# Altium footprint library Tomra_Cadstar_Footprints.PcbLib: 380 footprints (part 10 of 24)
Each footprint in its own frame and in the unit in brackets; x right, y up, seen from the top. Pads: shape width x height; smd on the part's side, far side on the other; paste and mask are expansions set on the pad; w line width, h text height; cw(c..) or ccw(c..) is an arc to the next point about the centre after c.
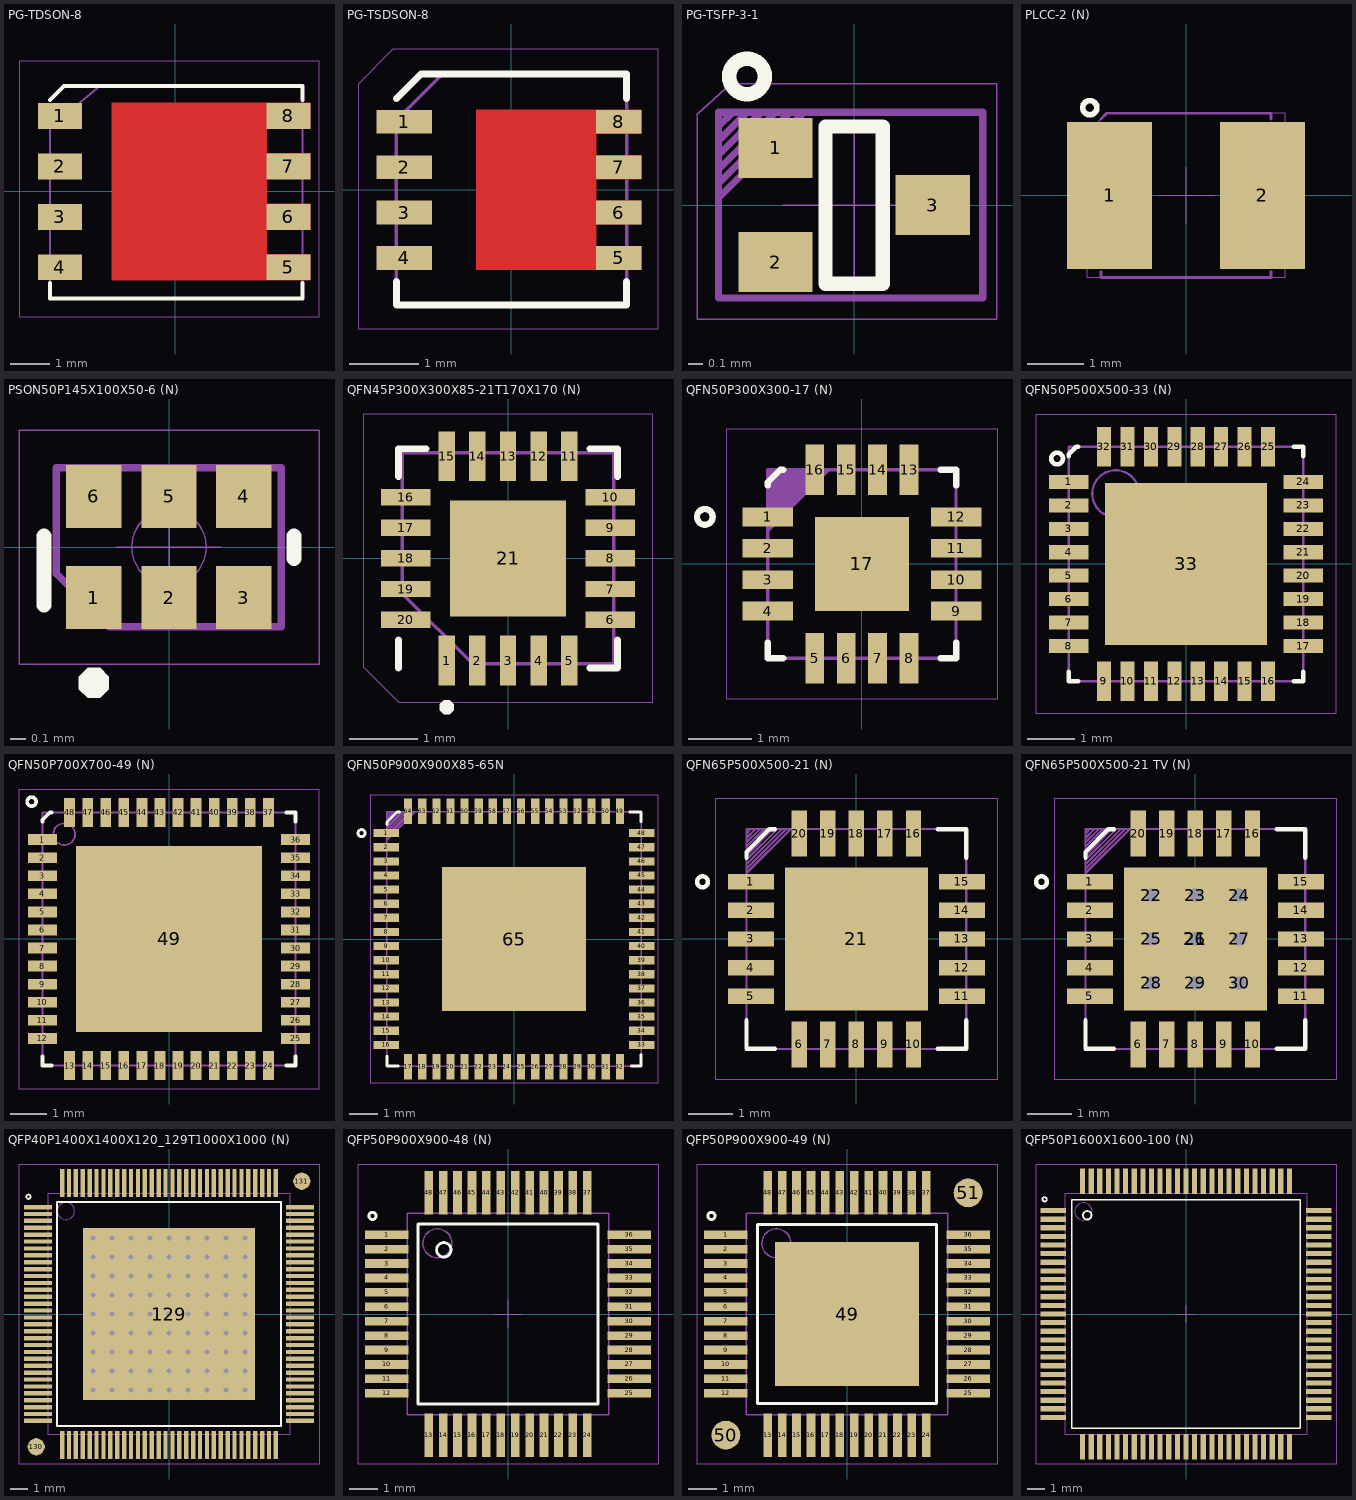
[diagram p9: the footprints below, top view; thin cyan lines are the x and y axes]

## PG-TDSON-8 [mm]
height 1
pads (8):
  rect 1.1x0.65 smd paste+0 mask+0: 1(-2.9,1.9) 2(-2.9,0.63) 3(-2.9,-0.64) 4(-2.9,-1.91) 5(2.85,-1.91) 6(2.85,-0.64) 7(2.85,0.63) 8(2.85,1.9)
Top Elec:
  region: -1.59,2.225 3.4,2.225 3.4,1.575 2.3,1.575 2.3,0.965 3.4,0.965 3.4,0.315 2.3,0.315 2.3,-0.305 3.4,-0.305 3.4,-0.955 2.3,-0.955 2.3,-1.585 3.4,-1.585 3.4,-2.235 -1.59,-2.235
Top Silk:
  lines w0.1: -3.15,-2.3 -3.15,-2.7 3.2,-2.7 3.2,-2.3 ; -3.15,2.3 -2.8,2.65 3.2,2.65 3.2,2.3
  text ".Designator" at 0,0 h0.7
Top Paste:
  region: -1.585,-2.225 0.1,-2.225 0.1,-0.32 -1.585,-0.32
  region: 0.93,-2.23 3.39,-2.23 3.39,-1.587 2.055,-1.587 2.055,-0.963 3.39,-0.963 3.39,-0.32 0.93,-0.32
  region: -1.585,0.31 0.1,0.31 0.1,2.215 -1.585,2.215
  region: 0.93,0.31 3.39,0.31 3.39,0.95 2.05,0.95 2.05,1.58 3.39,1.58 3.39,2.22 0.93,2.22
Top Solder Resist:
  region: -1.59,2.225 3.4,2.225 3.4,1.575 2.3,1.575 2.3,0.965 3.4,0.965 3.4,0.315 2.3,0.315 2.3,-0.305 3.4,-0.305 3.4,-0.955 2.3,-0.955 2.3,-1.585 3.4,-1.585 3.4,-2.235 -1.59,-2.235
Top Assembly:
  lines w0.05: -3.15,-2.7 3.2,-2.7 3.2,2.652 -1.899,2.652 -3.15,1.598 -3.15,-2.7
Top Placement:
  lines w0.01: -3.93,-3.159 3.62,-3.159 3.62,3.278 -3.93,3.28 -3.93,-3.159

## PG-TSDSON-8 [mm]
height 1
pads (8):
  rrect0% 0.8x0.34 smd paste+0 mask+0: 1(-1.538,0.975) 2(-1.538,0.325) 3(-1.538,-0.325) 4(-1.538,-0.975)
  rrect0% 0.65x0.34 smd paste+0 mask+0: 5(1.538,-0.975) 6(1.538,-0.325) 7(1.538,0.325) 8(1.538,0.975)
Top Elec:
  region: -0.502,1.146 1.862,1.146 1.862,0.805 1.212,0.805 1.212,0.495 1.862,0.495 1.862,0.155 1.212,0.155 1.212,-0.155 1.862,-0.155 1.862,-0.495 1.212,-0.495 1.212,-0.805 1.862,-0.805 1.862,-1.146 -0.502,-1.146
Top Silk:
  lines w0.1: -1.65,-1.31 -1.65,-1.65 1.65,-1.65 1.65,-1.31 ; -1.65,1.31 -1.3,1.66 1.65,1.66 1.65,1.31
  text ".Designator" at 0,0 h0.7
Top Paste:
  region: -0.5,0.152 0.35,0.152 0.35,1.132 -0.5,1.132
  region: 0.663,-1.14 1.857,-1.14 1.857,-0.81 1.207,-0.81 1.207,-0.488 1.857,-0.488 1.857,-0.163 0.663,-0.165
  region: 0.658,0.16 1.857,0.16 1.857,0.49 1.207,0.49 1.207,0.81 1.857,0.81 1.857,1.133 0.658,1.133
  region: -0.492,-1.14 0.351,-1.14 0.35,-0.158 -0.492,-0.157
Top Solder Resist:
  region: 1.863,1.15 1.863,0.8 1.212,0.8 1.212,0.503 1.863,0.503 1.863,0.15 1.212,0.15 1.212,-0.15 1.863,-0.15 1.863,-0.5 1.212,-0.5 1.212,-0.8 1.863,-0.8 1.863,-1.15 -0.513,-1.15 -0.513,1.15
Top Assembly:
  lines w0.05: -1.65,-1.65 1.65,-1.65 1.65,1.65 -1,1.65 -1.65,1 -1.65,-1.65
Top Placement:
  lines w0.01: -2.2,-1.987 2.1,-1.987 2.1,2.013 -1.7,2.013 -2.2,1.513 -2.2,-1.987

## PG-TSFP-3-1 [mm]
height 0.6
pads (3):
  rect 0.52x0.42 smd paste+0 mask+0: 1(-0.55,0.4) 2(-0.55,-0.4) 3(0.55,0)
Top Silk:
  lines w0.1: -0.875,0.9 cw(c-0.75,0.9) -0.625,0.9 cw(c-0.75,0.9) -0.875,0.9 ; -0.2,-0.55 0.2,-0.55 0.2,0.55 -0.2,0.55 -0.2,-0.55
  text ".Designator" at -3.599,0 h0.7
Top Assembly:
  lines w0.05: -0.95,0.05 -0.35,0.65 ; -0.95,0.15 -0.45,0.65 ; -0.95,0.25 -0.55,0.65 ; -0.95,0.35 -0.65,0.65 ; -0.95,0.45 -0.75,0.65 ; -0.95,0.55 -0.85,0.65 ; -0.95,-0.65 0.9,-0.65 0.9,0.65 -0.95,0.65 -0.95,-0.65
Top Placement:
  lines w0.01: -0.5,0 0.5,0 ; 0,-0.5 0,0.5 ; -1.1,-0.8 1,-0.8 1,0.85 -0.865,0.85 -1.1,0.636 -1.1,-0.8

## PLCC-2 (N) [mm]
height 2
pads (2):
  rrect0% 1.5x2.6 smd paste+0 mask+0: 1(-1.35,0) 2(1.35,0)
Top Silk:
  lines w0.1: -1.825,1.55 cw(c-1.7,1.55) -1.575,1.55 cw(c-1.7,1.55) -1.825,1.55
  text ".Designator" at -3.599,-0.35 h0.7
Top Assembly:
  lines w0.05: -1.5,-1.35 -1.5,-1.45 1.5,-1.45 1.5,-1.35 ; -1.5,1.35 -1.4,1.45 1.5,1.45 1.5,1.35
Top Placement:
  lines w0.01: -0.5,0 0.5,0 ; 0,-0.5 0,0.5 ; -1.75,-1.45 1.75,-1.45 1.75,1.45 -1.4,1.45 -1.75,1.1 -1.75,-1.45

## PSON50P145X100X50-6 (N) [mm]
height 0.5
pads (6):
  rect 0.37x0.42 smd paste+0 mask+0: 1(-0.5,-0.337) 2(0,-0.337) 3(0.5,-0.337) 4(0.5,0.337) 5(0,0.337) 6(-0.5,0.337)
Top Silk:
  region: -0.6,-0.905 -0.6,-0.864 -0.541,-0.805 -0.459,-0.805 -0.4,-0.864 -0.4,-0.905 -0.4,-0.946 -0.459,-1.005 -0.541,-1.005 -0.6,-0.946
  lines w0.1: -0.835,-0.385 -0.835,0.075 ; 0.835,-0.075 0.835,0.075
  text ".Designator" at -3.599,-0.35 h0.7
Top Assembly:
  lines w0.05: -0.75,-0.177 -0.397,-0.53 0.75,-0.53 0.75,0.53 -0.75,0.53 -0.75,-0.177
Top Placement:
  lines w0.01: -0.35,0 0.35,0 ; 0,-0.35 0,0.35 ; -1,-0.78 -1,0.78 1,0.78 1,-0.78 -1,-0.78 ; -0.25,0 cw(c0,0) 0.25,0 cw(c0,0) -0.25,0

## QFN45P300X300X85-21T170X170 (N) [mm]
height 0.85
pads (21):
  rect 0.24x0.73 smd paste+0 mask+0: 1(-0.9,-1.5) 2(-0.45,-1.5) 3(0,-1.5) 4(0.45,-1.5) 5(0.9,-1.5) 11(0.9,1.5) 12(0.45,1.5) 13(0,1.5) 14(-0.45,1.5) 15(-0.9,1.5)
  rect 0.73x0.24 smd paste+0 mask+0: 6(1.5,-0.9) 7(1.5,-0.45) 8(1.5,0) 9(1.5,0.45) 10(1.5,0.9) 16(-1.5,0.9) 17(-1.5,0.45) 18(-1.5,0) 19(-1.5,-0.45) 20(-1.5,-0.9)
  rect 1.7x1.7 smd paste+0 mask+0: 21(0,0)
Top Silk:
  region: -1,-2.185 -1,-2.144 -0.941,-2.085 -0.859,-2.085 -0.8,-2.144 -0.8,-2.185 -0.8,-2.226 -0.859,-2.285 -0.941,-2.285 -1,-2.226
  lines w0.1: -1.61,-1.61 -1.61,-1.2 ; -1.61,1.2 -1.61,1.61 -1.2,1.61 ; 1.2,-1.61 1.61,-1.61 1.61,-1.2 ; 1.2,1.61 1.61,1.61 1.61,1.2
  text ".Designator" at -3.599,-0.35 h0.7
Top Assembly:
  lines w0.05: -1.55,-0.517 -0.517,-1.55 1.55,-1.55 1.55,1.55 -1.55,1.55 -1.55,-0.517
Top Placement:
  lines w0.01: -0.35,0 0.35,0 ; 0,-0.35 0,0.35 ; -2.12,-1.6 -1.6,-2.12 2.12,-2.12 2.12,2.12 -2.12,2.12 -2.12,-1.6 ; -0.25,0 cw(c0,0) 0.25,0 cw(c0,0) -0.25,0

## QFN50P300X300-17 (N) [mm]
height 0.8
pads (17):
  rect 0.8x0.3 smd paste+0 mask+0: 1(-1.5,0.75) 2(-1.5,0.25) 3(-1.5,-0.25) 4(-1.5,-0.75) 9(1.5,-0.75) 10(1.5,-0.25) 11(1.5,0.25) 12(1.5,0.75)
  rect 0.3x0.8 smd paste+0 mask+0: 5(-0.75,-1.5) 6(-0.25,-1.5) 7(0.25,-1.5) 8(0.75,-1.5) 13(0.75,1.5) 14(0.25,1.5) 15(-0.25,1.5) 16(-0.75,1.5)
  rect 1.5x1.5 smd paste-0.55 mask+0: 17(0,0)
Top Silk:
  lines w0.1: -1.5,-1.25 -1.5,-1.5 -1.25,-1.5 ; -1.5,1.25 -1.5,1.3 -1.3,1.5 -1.25,1.5 ; 1.25,-1.5 1.5,-1.5 1.5,-1.25 ; 1.25,1.5 1.5,1.5 1.5,1.25 ; -2.625,0.75 cw(c-2.5,0.75) -2.375,0.75 cw(c-2.5,0.75) -2.625,0.75
  text ".Designator" at -2.15,2.15 h0.7
Top Assembly:
  region: -1.5,0.5 -1.5,1.5 -0.5,1.5
  lines w0.05: -1.5,-1.5 -1.5,1.5 1.5,1.5 1.5,-1.5 -1.5,-1.5
Top Placement:
  lines w0.01: -0.5,0 0.5,0 ; 0,-0.5 0,0.5 ; -2.15,-2.15 -2.15,2.15 2.15,2.15 2.15,-2.15 -2.15,-2.15

## QFN50P500X500-33 (N) [mm]
height 0.8
pads (33):
  rect 0.85x0.3 smd paste+0 mask+0: 1(-2.5,1.75) 2(-2.5,1.25) 3(-2.5,0.75) 4(-2.5,0.25) 5(-2.5,-0.25) 6(-2.5,-0.75) 7(-2.5,-1.25) 8(-2.5,-1.75) 17(2.5,-1.75) 18(2.5,-1.25) 19(2.5,-0.75) 20(2.5,-0.25) 21(2.5,0.25) 22(2.5,0.75) 23(2.5,1.25) 24(2.5,1.75)
  rect 0.3x0.85 smd paste+0 mask+0: 9(-1.75,-2.5) 10(-1.25,-2.5) 11(-0.75,-2.5) 12(-0.25,-2.5) 13(0.25,-2.5) 14(0.75,-2.5) 15(1.25,-2.5) 16(1.75,-2.5) 25(1.75,2.5) 26(1.25,2.5) 27(0.75,2.5) 28(0.25,2.5) 29(-0.25,2.5) 30(-0.75,2.5) 31(-1.25,2.5) 32(-1.75,2.5)
  rect 3.45x3.45 smd paste-1.268 mask+0: 33(0,0)
Top Silk:
  lines w0.1: -2.5,-2.3 -2.5,-2.5 -2.3,-2.5 ; -2.5,2.3 -2.5,2.34 -2.34,2.5 -2.3,2.5 ; 2.3,-2.5 2.5,-2.5 2.5,-2.3 ; 2.3,2.5 2.5,2.5 2.5,2.3 ; -2.875,2.25 cw(c-2.75,2.25) -2.625,2.25 cw(c-2.75,2.25) -2.875,2.25
  text ".Designator" at -3.599,-0.35 h0.7
Top Assembly:
  lines w0.05: -2.5,-2.5 -2.5,2.5 2.5,2.5 2.5,-2.5 -2.5,-2.5 ; -2,1.5 cw(c-1.5,1.5) -1,1.5 cw(c-1.5,1.5) -2,1.5
Top Placement:
  lines w0.01: -0.5,0 0.5,0 ; 0,-0.5 0,0.5 ; -3.2,-3.2 -3.2,3.2 3.2,3.2 3.2,-3.2 -3.2,-3.2

## QFN50P700X700-49 (N) [mm]
height 1
pads (49):
  rect 0.8x0.3 smd paste+0 mask+0: 1(-3.5,2.75) 2(-3.5,2.25) 3(-3.5,1.75) 4(-3.5,1.25) 5(-3.5,0.75) 6(-3.5,0.25) 7(-3.5,-0.25) 8(-3.5,-0.75) 9(-3.5,-1.25) 10(-3.5,-1.75) 11(-3.5,-2.25) 12(-3.5,-2.75) 25(3.5,-2.75) 26(3.5,-2.25) 27(3.5,-1.75) 28(3.5,-1.25) 29(3.5,-0.75) 30(3.5,-0.25) 31(3.5,0.25) 32(3.5,0.75) 33(3.5,1.25) 34(3.5,1.75) 35(3.5,2.25) 36(3.5,2.75)
  rect 0.3x0.8 smd paste+0 mask+0: 13(-2.75,-3.5) 14(-2.25,-3.5) 15(-1.75,-3.5) 16(-1.25,-3.5) 17(-0.75,-3.5) 18(-0.25,-3.5) 19(0.25,-3.5) 20(0.75,-3.5) 21(1.25,-3.5) 22(1.75,-3.5) 23(2.25,-3.5) 24(2.75,-3.5) 37(2.75,3.5) 38(2.25,3.5) 39(1.75,3.5) 40(1.25,3.5) 41(0.75,3.5) 42(0.25,3.5) 43(-0.25,3.5) 44(-0.75,3.5) 45(-1.25,3.5) 46(-1.75,3.5) 47(-2.25,3.5) 48(-2.75,3.5)
  rect 5.15x5.15 smd paste+0 mask+0: 49(0,0)
Top Silk:
  lines w0.1: -3.5,-3.25 -3.5,-3.5 -3.25,-3.5 ; -3.5,3.25 -3.5,3.3 -3.3,3.5 -3.25,3.5 ; 3.25,-3.5 3.5,-3.5 3.5,-3.25 ; 3.25,3.5 3.5,3.5 3.5,3.25 ; -3.925,3.8 cw(c-3.8,3.8) -3.675,3.8 cw(c-3.8,3.8) -3.925,3.8
  text ".Designator" at -3.599,4.45 h0.7
Top Paste:
  drawing of 25 lines, arcs and shapes, not listed
Top Assembly:
  lines w0.05: -3.5,-3.5 -3.5,3.5 3.5,3.5 3.5,-3.5 -3.5,-3.5 ; -3.2,2.9 cw(c-2.9,2.9) -2.6,2.9 cw(c-2.9,2.9) -3.2,2.9
Top Placement:
  lines w0.01: -4.15,-4.15 -4.15,4.15 4.15,4.15 4.15,-4.15 -4.15,-4.15

## QFN50P900X900X85-65N [mm]
height 0.85
pads (65):
  rect 0.9x0.29 smd paste+0 mask+0: 1(-4.525,3.75) 2(-4.525,3.25) 3(-4.525,2.75) 4(-4.525,2.25) 5(-4.525,1.75) 6(-4.525,1.25) 7(-4.525,0.75) 8(-4.525,0.25) 9(-4.525,-0.25) 10(-4.525,-0.75) 11(-4.525,-1.25) 12(-4.525,-1.75) 13(-4.525,-2.25) 14(-4.525,-2.75) 15(-4.525,-3.25) 16(-4.525,-3.75) 33(4.525,-3.75) 34(4.525,-3.25) 35(4.525,-2.75) 36(4.525,-2.25) 37(4.525,-1.75) 38(4.525,-1.25) 39(4.525,-0.75) 40(4.525,-0.25) 41(4.525,0.25) 42(4.525,0.75) 43(4.525,1.25) 44(4.525,1.75) 45(4.525,2.25) 46(4.525,2.75) 47(4.525,3.25) 48(4.525,3.75)
  rect 0.29x0.9 smd paste+0 mask+0: 17(-3.75,-4.525) 18(-3.25,-4.525) 19(-2.75,-4.525) 20(-2.25,-4.525) 21(-1.75,-4.525) 22(-1.25,-4.525) 23(-0.75,-4.525) 24(-0.25,-4.525) 25(0.25,-4.525) 26(0.75,-4.525) 27(1.25,-4.525) 28(1.75,-4.525) 29(2.25,-4.525) 30(2.75,-4.525) 31(3.25,-4.525) 32(3.75,-4.525) 49(3.75,4.525) 50(3.25,4.525) 51(2.75,4.525) 52(2.25,4.525) 53(1.75,4.525) 54(1.25,4.525) 55(0.75,4.525) 56(0.25,4.525) 57(-0.25,4.525) 58(-0.75,4.525) 59(-1.25,4.525) 60(-1.75,4.525) 61(-2.25,4.525) 62(-2.75,4.525) 63(-3.25,4.525) 64(-3.75,4.525)
  rect 5.1x5.1 smd paste+0 mask+0: 65(0,0)
Top Silk:
  lines w0.1: -4.5,-4.15 -4.5,-4.5 -4.1,-4.5 ; -4.5,4.05 -4.5,4.14 -4.14,4.5 -4.05,4.5 ; 4.1,4.5 4.5,4.5 4.5,4.15 ; 4.15,-4.5 4.5,-4.5 4.5,-4.1 ; -5.525,3.75 cw(c-5.4,3.75) -5.275,3.75 cw(c-5.4,3.75) -5.525,3.75
  text ".Designator" at -3.599,5.25 h0.7
Top Assembly:
  lines w0.05: -4.5,3.5 -3.5,4.5 ; -4.5,3.6 -3.6,4.5 ; -4.5,3.7 -3.7,4.5 ; -4.5,3.8 -3.8,4.5 ; -4.5,3.9 -3.9,4.5 ; -4.5,4 -4,4.5 ; -4.5,4.1 -4.1,4.5 ; -4.5,4.2 -4.2,4.5 ; -4.5,4.3 -4.3,4.5 ; -4.5,4.4 -4.4,4.5 ; -4.5,-4.5 -4.5,4.5 4.5,4.5 4.5,-4.5 -4.5,-4.5
Top Placement:
  lines w0.01: -5.1,-5.1 -5.1,5.1 5.1,5.1 5.1,-5.1 -5.1,-5.1

## QFN65P500X500-21 (N) [mm]
height 0.8
pads (21):
  rect 1.05x0.35 smd paste+0 mask+0: 1(-2.4,1.3) 2(-2.4,0.65) 3(-2.4,0) 4(-2.4,-0.65) 5(-2.4,-1.3) 11(2.4,-1.3) 12(2.4,-0.65) 13(2.4,0) 14(2.4,0.65) 15(2.4,1.3)
  rect 0.35x1.05 smd paste+0 mask+0: 6(-1.3,-2.4) 7(-0.65,-2.4) 8(0,-2.4) 9(0.65,-2.4) 10(1.3,-2.4) 16(1.3,2.4) 17(0.65,2.4) 18(0,2.4) 19(-0.65,2.4) 20(-1.3,2.4)
  rect 3.25x3.25 smd paste-1.2 mask+0: 21(0,0)
Top Silk:
  lines w0.1: -2.5,-1.85 -2.5,-2.5 -1.85,-2.5 ; -2.5,1.85 -2.5,1.98 -1.98,2.5 -1.85,2.5 ; 1.85,-2.5 2.5,-2.5 2.5,-1.85 ; 1.85,2.5 2.5,2.5 2.5,1.85 ; -3.625,1.3 cw(c-3.5,1.3) -3.375,1.3 cw(c-3.5,1.3) -3.625,1.3
  text ".Designator" at -3.599,-0.35 h0.7
Top Assembly:
  lines w0.05: -2.5,1.5 -1.5,2.5 ; -2.5,1.6 -1.6,2.5 ; -2.5,1.7 -1.7,2.5 ; -2.5,1.8 -1.8,2.5 ; -2.5,1.9 -1.9,2.5 ; -2.5,2 -2,2.5 ; -2.5,2.1 -2.1,2.5 ; -2.5,2.2 -2.2,2.5 ; -2.5,2.3 -2.3,2.5 ; -2.5,2.4 -2.4,2.5 ; -2.5,-2.5 -2.5,2.5 2.5,2.5 2.5,-2.5 -2.5,-2.5
Top Placement:
  lines w0.01: -0.5,0 0.5,0 ; 0,-0.5 0,0.5 ; -3.2,-3.2 -3.2,3.2 3.2,3.2 3.2,-3.2 -3.2,-3.2

## QFN65P500X500-21 TV (N) [mm]
height 0.8
pads (30):
  rect 1.05x0.35 smd paste+0 mask+0: 1(-2.4,1.3) 2(-2.4,0.65) 3(-2.4,0) 4(-2.4,-0.65) 5(-2.4,-1.3) 11(2.4,-1.3) 12(2.4,-0.65) 13(2.4,0) 14(2.4,0.65) 15(2.4,1.3)
  rect 0.35x1.05 smd paste+0 mask+0: 6(-1.3,-2.4) 7(-0.65,-2.4) 8(0,-2.4) 9(0.65,-2.4) 10(1.3,-2.4) 16(1.3,2.4) 17(0.65,2.4) 18(0,2.4) 19(-0.65,2.4) 20(-1.3,2.4)
  rect 3.25x3.25 smd paste-1.2 mask+0: 21(0,0)
  round 0.6 / inner round 1.524 / far side round 0.6 hole 0.3 paste+0 mask+0: 22(-1,1) 23(0,1) 24(1,1) 25(-1,0) 26(0,0) 27(1,0) 28(-1,-1) 29(0,-1) 30(1,-1)
Top Elec:
  lines w0.1: 1,-1 0,-1 -1,-1 -1,0 ; 1,0 0,0 -1,0 ; 1,1 0,1 -1,1 -1,0
Top Silk:
  lines w0.1: -2.5,-1.85 -2.5,-2.5 -1.85,-2.5 ; -2.5,1.85 -2.5,1.98 -1.98,2.5 -1.85,2.5 ; 1.85,-2.5 2.5,-2.5 2.5,-1.85 ; 1.85,2.5 2.5,2.5 2.5,1.85 ; -3.625,1.3 cw(c-3.5,1.3) -3.375,1.3 cw(c-3.5,1.3) -3.625,1.3
  text ".Designator" at -3.599,-0.35 h0.7
Top Assembly:
  lines w0.05: -2.5,1.5 -1.5,2.5 ; -2.5,1.6 -1.6,2.5 ; -2.5,1.7 -1.7,2.5 ; -2.5,1.8 -1.8,2.5 ; -2.5,1.9 -1.9,2.5 ; -2.5,2 -2,2.5 ; -2.5,2.1 -2.1,2.5 ; -2.5,2.2 -2.2,2.5 ; -2.5,2.3 -2.3,2.5 ; -2.5,2.4 -2.4,2.5 ; -2.5,-2.5 -2.5,2.5 2.5,2.5 2.5,-2.5 -2.5,-2.5
Top Placement:
  lines w0.01: -0.5,0 0.5,0 ; 0,-0.5 0,0.5 ; -3.2,-3.2 -3.2,3.2 3.2,3.2 3.2,-3.2 -3.2,-3.2

## QFP40P1400X1400X120_129T1000X1000 (N) [mm]
height 1.2
pads (212):
  rect 1.6x0.25 smd paste+0 mask+0: 1(-7.6,6.2) 2(-7.6,5.8) 3(-7.6,5.4) 4(-7.6,5) 5(-7.6,4.6) 6(-7.6,4.2) 7(-7.6,3.8) 8(-7.6,3.4) 9(-7.6,3) 10(-7.6,2.6) 11(-7.6,2.2) 12(-7.6,1.8) 13(-7.6,1.4) 14(-7.6,1) 15(-7.6,0.6) 16(-7.6,0.2) 17(-7.6,-0.2) 18(-7.6,-0.6) 19(-7.6,-1) 20(-7.6,-1.4) 21(-7.6,-1.8) 22(-7.6,-2.2) 23(-7.6,-2.6) 24(-7.6,-3) 25(-7.6,-3.4) 26(-7.6,-3.8) 27(-7.6,-4.2) 28(-7.6,-4.6) 29(-7.6,-5) 30(-7.6,-5.4) 31(-7.6,-5.8) 32(-7.6,-6.2) 65(7.6,-6.2) 66(7.6,-5.8) 67(7.6,-5.4) 68(7.6,-5) 69(7.6,-4.6) 70(7.6,-4.2) 71(7.6,-3.8) 72(7.6,-3.4) 73(7.6,-3) 74(7.6,-2.6) 75(7.6,-2.2) 76(7.6,-1.8) 77(7.6,-1.4) 78(7.6,-1) 79(7.6,-0.6) 80(7.6,-0.2) 81(7.6,0.2) 82(7.6,0.6) 83(7.6,1) 84(7.6,1.4) 85(7.6,1.8) 86(7.6,2.2) 87(7.6,2.6) 88(7.6,3) 89(7.6,3.4) 90(7.6,3.8) 91(7.6,4.2) 92(7.6,4.6) 93(7.6,5) 94(7.6,5.4) 95(7.6,5.8) 96(7.6,6.2)
  rect 0.25x1.6 smd paste+0 mask+0: 33(-6.2,-7.6) 34(-5.8,-7.6) 35(-5.4,-7.6) 36(-5,-7.6) 37(-4.6,-7.6) 38(-4.2,-7.6) 39(-3.8,-7.6) 40(-3.4,-7.6) 41(-3,-7.6) 42(-2.6,-7.6) 43(-2.2,-7.6) 44(-1.8,-7.6) 45(-1.4,-7.6) 46(-1,-7.6) 47(-0.6,-7.6) 48(-0.2,-7.6) 49(0.2,-7.6) 50(0.6,-7.6) 51(1,-7.6) 52(1.4,-7.6) 53(1.8,-7.6) 54(2.2,-7.6) 55(2.6,-7.6) 56(3,-7.6) 57(3.4,-7.6) 58(3.8,-7.6) 59(4.2,-7.6) 60(4.6,-7.6) 61(5,-7.6) 62(5.4,-7.6) 63(5.8,-7.6) 64(6.2,-7.6) 97(6.2,7.6) 98(5.8,7.6) 99(5.4,7.6) 100(5,7.6) 101(4.6,7.6) 102(4.2,7.6) 103(3.8,7.6) 104(3.4,7.6) 105(3,7.6) 106(2.6,7.6) 107(2.2,7.6) 108(1.8,7.6) 109(1.4,7.6) 110(1,7.6) 111(0.6,7.6) 112(0.2,7.6) 113(-0.2,7.6) 114(-0.6,7.6) 115(-1,7.6) 116(-1.4,7.6) 117(-1.8,7.6) 118(-2.2,7.6) 119(-2.6,7.6) 120(-3,7.6) 121(-3.4,7.6) 122(-3.8,7.6) 123(-4.2,7.6) 124(-4.6,7.6) 125(-5,7.6) 126(-5.4,7.6) 127(-5.8,7.6) 128(-6.2,7.6)
  rect 10x10 smd paste+0 mask+0: 129(0,0)
  round 1 smd paste+0 mask+0: 130(-7.7,-7.7) 131(7.7,7.7)
  round 0.6 / inner round 1.524 / far side round 0.6 hole 0.3 paste+0 mask+0: 132(-4.4,4.4) 133(-3.3,4.4) 134(-2.2,4.4) 135(-1.1,4.4) 136(0,4.4) 137(1.1,4.4) 138(2.2,4.4) 139(3.3,4.4) 140(4.4,4.4) 141(-4.4,3.3) 142(-3.3,3.3) 143(-2.2,3.3) 144(-1.1,3.3) 145(0,3.3) 146(1.1,3.3) 147(2.2,3.3) 148(3.3,3.3) 149(4.4,3.3) 150(-4.4,2.2) 151(-3.3,2.2) 152(-2.2,2.2) 153(-1.1,2.2) 154(0,2.2) 155(1.1,2.2) 156(2.2,2.2) 157(3.3,2.2) 158(4.4,2.2) 159(-4.4,1.1) 160(-3.3,1.1) 161(-2.2,1.1) 162(-1.1,1.1) 163(0,1.1) 164(1.1,1.1) 165(2.2,1.1) 166(3.3,1.1) 167(4.4,1.1) 168(-4.4,0) 169(-3.3,0) 170(-2.2,0) 171(-1.1,0) 172(0,0) 173(1.1,0) 174(2.2,0) 175(3.3,0) 176(4.4,0) 177(-4.4,-1.1) 178(-3.3,-1.1) 179(-2.2,-1.1) 180(-1.1,-1.1) 181(0,-1.1) 182(1.1,-1.1) 183(2.2,-1.1) 184(3.3,-1.1) 185(4.4,-1.1) 186(-4.4,-2.2) 187(-3.3,-2.2) 188(-2.2,-2.2) 189(-1.1,-2.2) 190(0,-2.2) 191(1.1,-2.2) 192(2.2,-2.2) 193(3.3,-2.2) 194(4.4,-2.2) 195(-4.4,-3.3) 196(-3.3,-3.3) 197(-2.2,-3.3) 198(-1.1,-3.3) 199(0,-3.3) 200(1.1,-3.3) 201(2.2,-3.3) 202(3.3,-3.3) 203(4.4,-3.3) 204(-4.4,-4.4) 205(-3.3,-4.4) 206(-2.2,-4.4) 207(-1.1,-4.4) 208(0,-4.4) 209(1.1,-4.4) 210(2.2,-4.4) 211(3.3,-4.4) 212(4.4,-4.4)
Top Elec:
  lines w0.1: 4.4,-4.4 3.3,-4.4 2.2,-4.4 1.1,-4.4 0,-4.4 -1.1,-4.4 -2.2,-4.4 -3.3,-4.4 -4.4,-4.4 -4.4,-3.3 -3.3,-3.3 -2.2,-3.3 -1.1,-3.3 0,-3.3 1.1,-3.3 2.2,-3.3 3.3,-3.3 4.4,-3.3 4.4,-2.2 3.3,-2.2 2.2,-2.2 1.1,-2.2 0,-2.2 -1.1,-2.2 -2.2,-2.2 -3.3,-2.2 -4.4,-2.2 -4.4,-1.1 -3.3,-1.1 -2.2,-1.1 -1.1,-1.1 0,-1.1 1.1,-1.1 2.2,-1.1 3.3,-1.1 4.4,-1.1 4.4,0 3.3,0 2.2,0 1.1,0 0,0 ; 0,0 -4.4,4.4 -3.3,4.4 -2.2,4.4 -1.1,4.4 0,4.4 1.1,4.4 2.2,4.4 3.3,4.4 4.4,4.4 4.4,3.3 3.3,3.3 2.2,3.3 1.1,3.3 0,3.3 -1.1,3.3 -2.2,3.3 -3.3,3.3 -4.4,3.3 -4.4,2.2 -3.3,2.2 -2.2,2.2 -1.1,2.2 0,2.2 1.1,2.2 2.2,2.2 3.3,2.2 4.4,2.2 4.4,1.1 3.3,1.1 2.2,1.1 1.1,1.1 0,1.1 -1.1,1.1 -2.2,1.1 -3.3,1.1 -4.4,1.1 -4.4,0 -3.3,0 -2.2,0 -1.1,0 0,0
Top Silk:
  lines w0.1: -8.275,6.8 cw(c-8.15,6.8) -8.025,6.8 cw(c-8.15,6.8) -8.275,6.8 ; -6.5,-6.5 -6.5,6.5 6.5,6.5 6.5,-6.5 -6.5,-6.5
  text ".Designator" at -3.599,9.05 h0.7
Top Paste:
  drawing of 64 lines, arcs and shapes, not listed
Top Assembly:
  lines w0.05: -7,-7 -7,7 7,7 7,-7 -7,-7 ; -6.475,5.975 cw(c-5.975,5.975) -5.475,5.975 cw(c-5.975,5.975) -6.475,5.975
Top Placement:
  lines w0.01: -8.7,-8.7 -8.7,8.7 8.7,8.7 8.7,-8.7 -8.7,-8.7

## QFP50P900X900-48 (N) [mm]
height 1.6
pads (48):
  rect 1.5x0.3 smd paste+0 mask+0: 1(-4.2,2.75) 2(-4.2,2.25) 3(-4.2,1.75) 4(-4.2,1.25) 5(-4.2,0.75) 6(-4.2,0.25) 7(-4.2,-0.25) 8(-4.2,-0.75) 9(-4.2,-1.25) 10(-4.2,-1.75) 11(-4.2,-2.25) 12(-4.2,-2.75) 25(4.2,-2.75) 26(4.2,-2.25) 27(4.2,-1.75) 28(4.2,-1.25) 29(4.2,-0.75) 30(4.2,-0.25) 31(4.2,0.25) 32(4.2,0.75) 33(4.2,1.25) 34(4.2,1.75) 35(4.2,2.25) 36(4.2,2.75)
  rect 0.3x1.5 smd paste+0 mask+0: 13(-2.75,-4.2) 14(-2.25,-4.2) 15(-1.75,-4.2) 16(-1.25,-4.2) 17(-0.75,-4.2) 18(-0.25,-4.2) 19(0.25,-4.2) 20(0.75,-4.2) 21(1.25,-4.2) 22(1.75,-4.2) 23(2.25,-4.2) 24(2.75,-4.2) 37(2.75,4.2) 38(2.25,4.2) 39(1.75,4.2) 40(1.25,4.2) 41(0.75,4.2) 42(0.25,4.2) 43(-0.25,4.2) 44(-0.75,4.2) 45(-1.25,4.2) 46(-1.75,4.2) 47(-2.25,4.2) 48(-2.75,4.2)
Top Silk:
  lines w0.1: -4.825,3.4 cw(c-4.7,3.4) -4.575,3.4 cw(c-4.7,3.4) -4.825,3.4 ; -3.125,-3.125 -3.125,3.125 3.125,3.125 3.125,-3.125 -3.125,-3.125 ; -2.475,2.225 cw(c-2.225,2.225) -1.975,2.225 cw(c-2.225,2.225) -2.475,2.225
  text ".Designator" at -3.599,-0.35 h0.7
Top Assembly:
  lines w0.05: -3.5,-3.5 -3.5,3.5 3.5,3.5 3.5,-3.5 -3.5,-3.5 ; -2.95,2.45 cw(c-2.45,2.45) -1.95,2.45 cw(c-2.45,2.45) -2.95,2.45
Top Placement:
  lines w0.01: -0.5,0 0.5,0 ; 0,-0.5 0,0.5 ; -5.2,-5.2 -5.2,5.2 5.2,5.2 5.2,-5.2 -5.2,-5.2

## QFP50P900X900-49 (N) [mm]
height 1.2
pads (51):
  rect 1.5x0.3 smd paste+0 mask+0: 1(-4.2,2.75) 2(-4.2,2.25) 3(-4.2,1.75) 4(-4.2,1.25) 5(-4.2,0.75) 6(-4.2,0.25) 7(-4.2,-0.25) 8(-4.2,-0.75) 9(-4.2,-1.25) 10(-4.2,-1.75) 11(-4.2,-2.25) 12(-4.2,-2.75) 25(4.2,-2.75) 26(4.2,-2.25) 27(4.2,-1.75) 28(4.2,-1.25) 29(4.2,-0.75) 30(4.2,-0.25) 31(4.2,0.25) 32(4.2,0.75) 33(4.2,1.25) 34(4.2,1.75) 35(4.2,2.25) 36(4.2,2.75)
  rect 0.3x1.5 smd paste+0 mask+0: 13(-2.75,-4.2) 14(-2.25,-4.2) 15(-1.75,-4.2) 16(-1.25,-4.2) 17(-0.75,-4.2) 18(-0.25,-4.2) 19(0.25,-4.2) 20(0.75,-4.2) 21(1.25,-4.2) 22(1.75,-4.2) 23(2.25,-4.2) 24(2.75,-4.2) 37(2.75,4.2) 38(2.25,4.2) 39(1.75,4.2) 40(1.25,4.2) 41(0.75,4.2) 42(0.25,4.2) 43(-0.25,4.2) 44(-0.75,4.2) 45(-1.25,4.2) 46(-1.75,4.2) 47(-2.25,4.2) 48(-2.75,4.2)
  rect 5x5 smd paste+0 mask+0: 49(0,0)
  round 1 smd paste+0 mask+0: 50(-4.2,-4.2) 51(4.2,4.2)
Top Silk:
  lines w0.1: -4.825,3.4 cw(c-4.7,3.4) -4.575,3.4 cw(c-4.7,3.4) -4.825,3.4 ; -3.1,-3.1 -3.1,3.1 3.1,3.1 3.1,-3.1 -3.1,-3.1
  text ".Designator" at -3.599,-0.35 h0.7
Top Assembly:
  lines w0.05: -3.5,-3.5 -3.5,3.5 3.5,3.5 3.5,-3.5 -3.5,-3.5 ; -2.95,2.45 cw(c-2.45,2.45) -1.95,2.45 cw(c-2.45,2.45) -2.95,2.45
Top Placement:
  lines w0.01: -0.5,0 0.5,0 ; 0,-0.5 0,0.5 ; -5.2,-5.2 -5.2,5.2 5.2,5.2 5.2,-5.2 -5.2,-5.2

## QFP50P1600X1600-100 (N) [mm]
height 1.7
pads (100):
  rect 1.5x0.3 smd paste+0 mask+0: 1(-7.7,6) 2(-7.7,5.5) 3(-7.7,5) 4(-7.7,4.5) 5(-7.7,4) 6(-7.7,3.5) 7(-7.7,3) 8(-7.7,2.5) 9(-7.7,2) 10(-7.7,1.5) 11(-7.7,1) 12(-7.7,0.5) 13(-7.7,0) 14(-7.7,-0.5) 15(-7.7,-1) 16(-7.7,-1.5) 17(-7.7,-2) 18(-7.7,-2.5) 19(-7.7,-3) 20(-7.7,-3.5) 21(-7.7,-4) 22(-7.7,-4.5) 23(-7.7,-5) 24(-7.7,-5.5) 25(-7.7,-6) 51(7.7,-6) 52(7.7,-5.5) 53(7.7,-5) 54(7.7,-4.5) 55(7.7,-4) 56(7.7,-3.5) 57(7.7,-3) 58(7.7,-2.5) 59(7.7,-2) 60(7.7,-1.5) 61(7.7,-1) 62(7.7,-0.5) 63(7.7,0) 64(7.7,0.5) 65(7.7,1) 66(7.7,1.5) 67(7.7,2) 68(7.7,2.5) 69(7.7,3) 70(7.7,3.5) 71(7.7,4) 72(7.7,4.5) 73(7.7,5) 74(7.7,5.5) 75(7.7,6)
  rect 0.3x1.5 smd paste+0 mask+0: 26(-6,-7.7) 27(-5.5,-7.7) 28(-5,-7.7) 29(-4.5,-7.7) 30(-4,-7.7) 31(-3.5,-7.7) 32(-3,-7.7) 33(-2.5,-7.7) 34(-2,-7.7) 35(-1.5,-7.7) 36(-1,-7.7) 37(-0.5,-7.7) 38(0,-7.7) 39(0.5,-7.7) 40(1,-7.7) 41(1.5,-7.7) 42(2,-7.7) 43(2.5,-7.7) 44(3,-7.7) 45(3.5,-7.7) 46(4,-7.7) 47(4.5,-7.7) 48(5,-7.7) 49(5.5,-7.7) 50(6,-7.7) 76(6,7.7) 77(5.5,7.7) 78(5,7.7) 79(4.5,7.7) 80(4,7.7) 81(3.5,7.7) 82(3,7.7) 83(2.5,7.7) 84(2,7.7) 85(1.5,7.7) 86(1,7.7) 87(0.5,7.7) 88(0,7.7) 89(-0.5,7.7) 90(-1,7.7) 91(-1.5,7.7) 92(-2,7.7) 93(-2.5,7.7) 94(-3,7.7) 95(-3.5,7.7) 96(-4,7.7) 97(-4.5,7.7) 98(-5,7.7) 99(-5.5,7.7) 100(-6,7.7)
Top Silk:
  lines w0.1: -8.325,6.65 cw(c-8.2,6.65) -8.075,6.65 cw(c-8.2,6.65) -8.325,6.65 ; -6.625,-6.625 -6.625,6.625 6.625,6.625 6.625,-6.625 -6.625,-6.625 ; -5.975,5.725 cw(c-5.725,5.725) -5.475,5.725 cw(c-5.725,5.725) -5.975,5.725
  text ".Designator" at -3.599,-0.35 h0.7
Top Assembly:
  lines w0.05: -7,-7 -7,7 7,7 7,-7 -7,-7 ; -6.45,5.95 cw(c-5.95,5.95) -5.45,5.95 cw(c-5.95,5.95) -6.45,5.95
Top Placement:
  lines w0.01: -0.5,0 0.5,0 ; 0,-0.5 0,0.5 ; -8.7,-8.7 -8.7,8.7 8.7,8.7 8.7,-8.7 -8.7,-8.7